# Altium footprint library CUSTOM PCB.PcbLib: 404 footprints (part 13 of 26)
Each footprint in its own frame and in the unit in brackets; x right, y up, seen from the top. Pads: shape width x height; smd on the part's side, far side on the other; paste and mask are expansions set on the pad; w line width, h text height; cw(c..) or ccw(c..) is an arc to the next point about the centre after c.
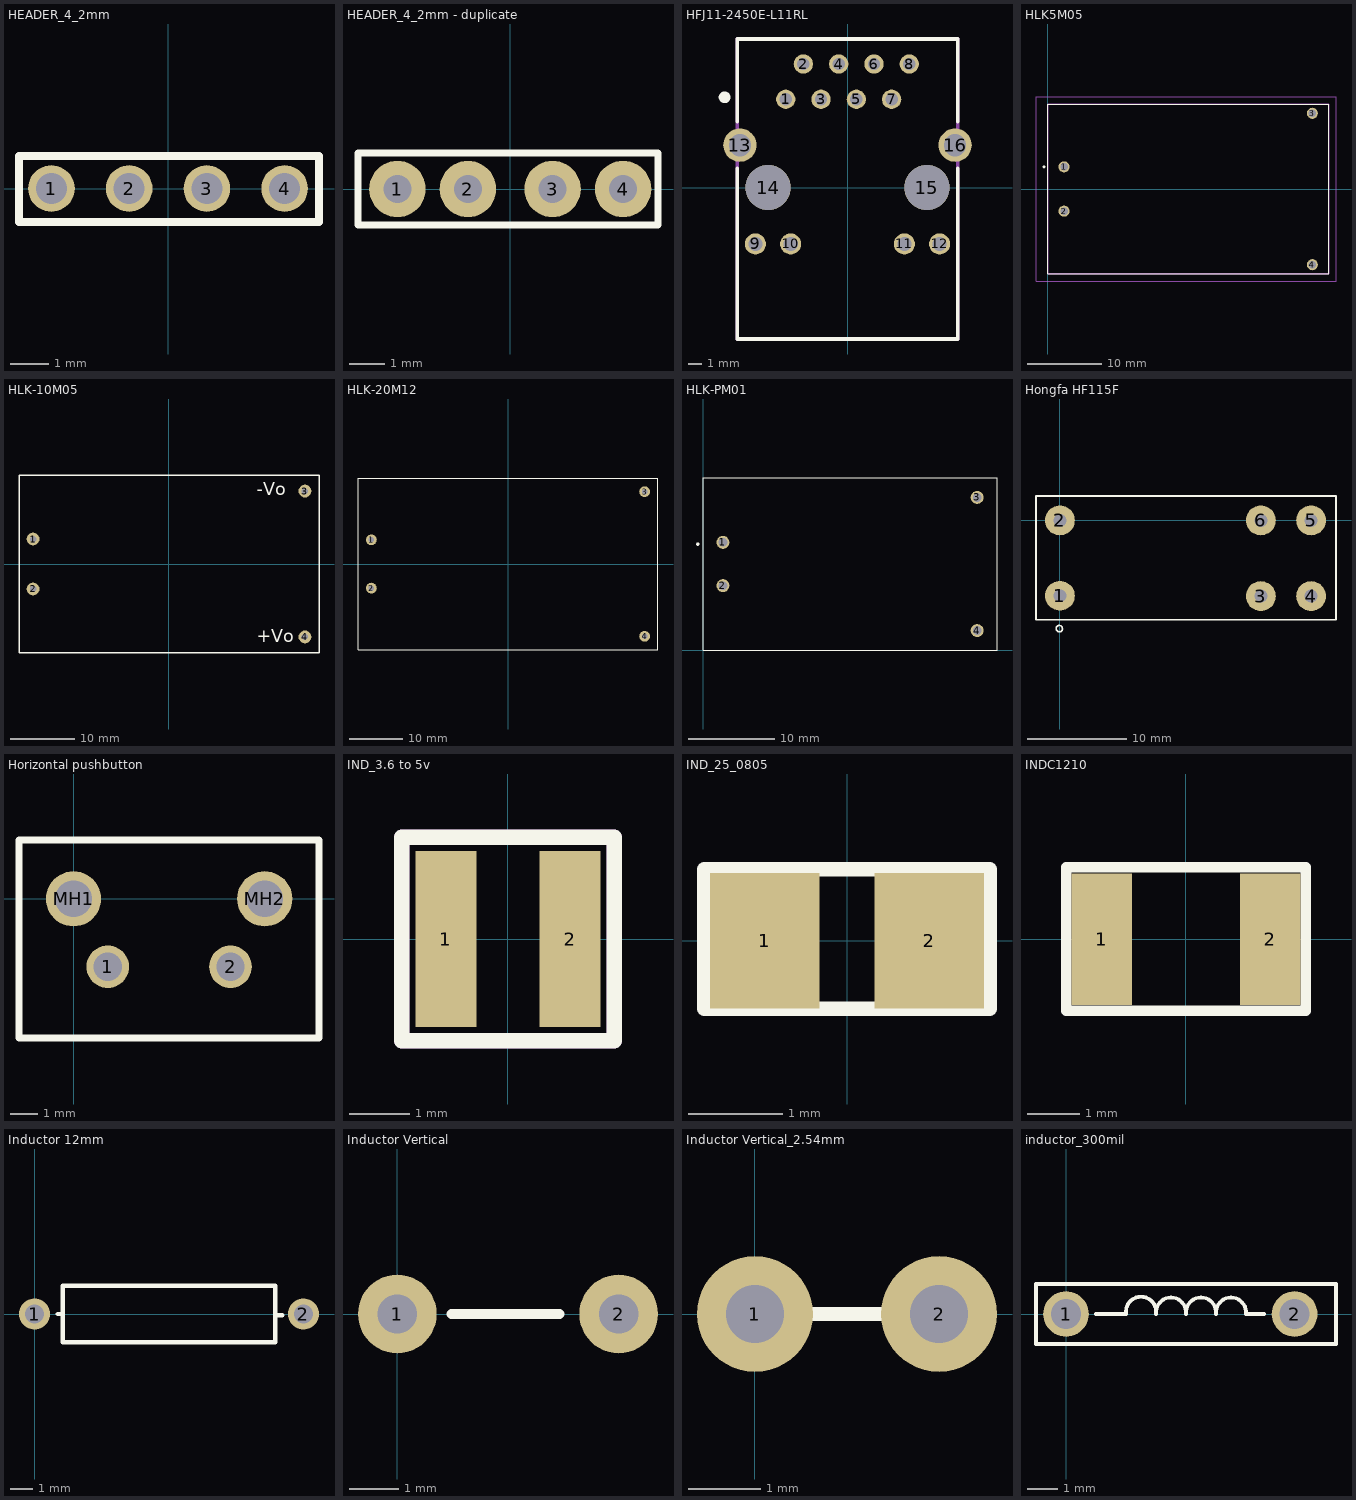
[diagram p12: the footprints below, top view; thin cyan lines are the x and y axes]

## HEADER_4_2mm [mm]
pads (4):
  round 1.2 hole 0.8: 1(-3,0) 2(-1,0) 3(1,0) 4(3,0)
Top Overlay:
  lines w0.2: -3.835,-0.864 -3.835,0.838 3.886,0.838 3.886,-0.864 -3.835,-0.864

## HEADER_4_2mm - duplicate [mm]
pads (4):
  round 1.6 hole 0.8: 1(-3.2,0) 2(-1.2,0) 3(1.2,0) 4(3.2,0)
Top Overlay:
  lines w0.2: -4.318,-1.016 -4.318,1.016 4.191,1.016 4.191,-1.016 -4.318,-1.016

## HFJ11-2450E-L11RL [mm]
pads (16):
  round 1.39 hole 0.89: 1(-4.445,6.35) 2(-3.175,8.89) 3(-1.905,6.35) 4(-0.635,8.89) 5(0.635,6.35) 6(1.905,8.89) 7(3.175,6.35) 8(4.445,8.89)
  round 1.52 hole 1.02: 9(-6.63,-4.06) 10(-4.09,-4.06) 11(4.09,-4.06) 12(6.63,-4.06)
  round 2.4 hole 1.6: 13(-7.745,3.05) 16(7.745,3.05)
  round 3.25 hole 3.25 unplated: 14(-5.715,0) 15(5.715,0)
Top Overlay:
  circle w0.5: c-8.845,6.494 r0.174
  lines w0.254: -7.94,1.4 -7.94,-10.9 7.94,-10.9 7.94,1.4 ; -7.94,4.75 -7.94,10.69 7.94,10.69 7.94,4.75
Mechanical 13:
  lines w0.254: -7.94,-10.9 -7.94,10.69 7.94,10.69 7.94,-10.9 -7.94,-10.9
3D body "Halo RJ45 Socket HFJ11-1G01ERL.STEP": height 15.57, standoff -3.12, extent -9.5,-10.795 9.5,10.795

## HLK5M05 [mm]
pads (4):
  round 1.5 hole 1: 1(2.2,3) 2(2.2,-3) 3(35.8,10.25) 4(35.8,-10.25)
Top Overlay:
  lines w0.1: 0,-11.5 38,-11.5 38,11.5 0,11.5 0,-11.5
  lines w0.2: -0.5,2.9 ccw(c-0.5,3) -0.5,3.1 ccw(c-0.5,3) -0.5,2.9
Mechanical 15:
  lines w0.2: 0,-11.5 38,-11.5 38,11.5 0,11.5 0,-11.5
Mechanical 20:
  lines w0.1: -1.6,-12.5 39,-12.5 39,12.5 -1.6,12.5 -1.6,-12.5
3D body: height 18, standoff 0, extent 0.01,-11.61 38.18,11.48
3D body: height 0, standoff -5, extent 34.808,-11.248 36.8,-9.252
3D body: height 0, standoff -5, extent 34.808,9.252 36.8,11.248
3D body: height 0, standoff -5, extent 1.208,2.002 3.2,3.998
3D body: height 0, standoff -5, extent 1.208,-3.998 3.2,-2.002

## HLK-10M05 [mm]
pads (4):
  round 2 hole 1: 1(-21.25,3.9) 2(-21.25,-3.9) 3(21.25,11.4) 4(21.25,-11.4)
Top Overlay:
  lines w0.2: -23.45,-13.9 -23.45,13.9 23.45,13.9 23.45,-13.9 -23.45,-13.9
  text "-Vo" at 13.736,10.713 h2
  text "+Vo" at 13.736,-12.249 h2
3D body: height 21.8, standoff 0, extent -23.45,-13.9 23.45,13.959

## HLK-20M12 [mm]
pads (4):
  round 2 hole 1: 1(-25.5,4.5) 2(-25.5,-4.5) 3(25.5,13.5) 4(25.5,-13.5)
Top Overlay:
  lines w0.2: -28,-16 -28,16 28,16 28,-16 -28,-16
3D body: height 22.5, standoff 0, extent -28,-16 28,16

## HLK-PM01 [mm]
pads (4):
  round 1.5 hole 1: 1(2.3,12.5) 2(2.3,7.5) 3(31.7,17.7) 4(31.7,2.3)
Top Overlay:
  lines w0.1: 0,0 34,0 34,20 0,20 0,0
  lines w0.2: -0.6,12.2 ccw(c-0.6,12.3) -0.6,12.4 ccw(c-0.6,12.3) -0.6,12.2
3D body: height 5, standoff 0, extent 1.903,7.101 2.7,7.899
3D body: height 5, standoff 0, extent 1.903,12.101 2.7,12.899
3D body: height 5, standoff 0, extent 31.303,1.901 32.1,2.699
3D body: height 5, standoff 0, extent 31.303,17.301 32.1,18.099
3D body: height 15, standoff 0, extent 0,0 34,20

## Hongfa HF115F [mm] "5VDC 16A"
pads (6):
  round 3 hole 1.3: 1(0,-7.56) 2(0,0) 3(20.16,-7.6) 4(25.2,-7.6) 5(25.2,0) 6(20.16,0)
Top Overlay:
  circle w0.127: c-0.06,-10.86 r0.322
  lines w0.19: -2.4,2.4 -2.4,-9.97 27.58,-9.97 27.7,-9.97 27.7,2.43 -2.4,2.43
3D body: height 15.7, standoff 0, extent -2.33,-9.97 27.69,2.4

## Horizontal pushbutton [mm]
pads (4):
  round 1.561 hole 1.041: 1(1.255,-2.49) 2(5.755,-2.49)
  round 2.026 hole 1.351: MH1(0,0) MH2(7.01,0)
Top Overlay:
  lines w0.254: -2,-5.105 9,-5.105 9,2.159 -2,2.159 -2,-5.105
3D body "User Library-Alps TACT SKHH Horizontal Switch.X_T": height 7.37, standoff -3.5, extent -0.496,-10.921 7.862,1.549

## IND_3.6 to 5v [mm] "EPL3015-472MLB"
pads (2):
  rect 1x2.9 smd: 1(-1.023,0) 2(1.023,0)
Top Overlay:
  lines w0.254: -1.753,-1.676 1.753,-1.676 1.753,1.676 -1.753,1.676 -1.753,-1.676
Mechanical 1:
  lines w0.254: 1.702,-1.676 -1.753,-1.676 -1.753,1.676 1.753,1.676 ; 1.753,-1.676 1.753,1.626
3D body "EPL3015-472MLB.stp": height 1.55, standoff 0, extent -1.5,-1.5 1.5,1.5

## IND_25_0805 [mil]
pads (2):
  rect 46x57 smd paste+0 mask+0: 1(-34.5,0) 2(34.5,0)
Top Overlay:
  lines w6: -60,-28.5 -60,30 60,30 60,-28.5 -60,-28.5
3D body "IND_25_0805.step": height 42.99, standoff 0, extent -43.5,-28.5 43.5,28.5

## INDC1210 [mm]
pads (2):
  rect 1.145x2.5 smd: 1(-1.6,0) 2(1.6,0)
Top Overlay:
  lines w0.2: -2.275,-1.358 2.277,-1.358 2.277,1.362 -2.275,1.362 -2.275,-1.358

## Inductor 12mm [mm]
pads (2):
  round 1.4 hole 0.85: 1(0,0) 2(12.065,0)
Top Overlay:
  lines w0.2: 1.041,0 1.27,0 ; 10.897,-0.051 11.125,-0.051 ; 1.27,-1.27 10.795,-1.27 10.795,1.27 1.27,1.27 1.27,-1.27
3D body: height 0.25, standoff 0, extent 3.607,1.829 3.607,1.829
3D body: height 0.25, standoff 0, extent 0.66,1.499 0.66,1.499
3D body "User Library-res_05x12_5.STEP": height 1.6, standoff -3.8, extent -0.53,-1.6 12.57,1.6

## Inductor Vertical [mm]
pads (2):
  round 1.6 hole 0.8: 1(0,0) 2(4.5,0)
Top Overlay:
  lines w0.2: 1.1,0 3.3,0

## Inductor Vertical_2.54mm [mm]
pads (2):
  round 1.6 hole 0.8: 1(0,0)
  round 1.6 hole 0.8 paste+0: 2(2.54,0)
Top Overlay:
  lines w0.2: 0,0 2.54,0

## inductor_300mil [mil] "1mH"
pads (2):
  round 60 hole 39.37: 1(0,0) 2(300,0)
Top Overlay:
  lines w5: 39.37,0 78.74,0 cw(c98.43,2.76) 118.11,0 cw(c137.8,1.88) 157.48,0 cw(c177.17,1.9) 196.85,0 cw(c216.54,1.88) 236.22,0 259.84,0 ; -39.37,-39.37 354.33,-39.37 354.33,39.37 -39.37,39.37 -39.37,-39.37
3D body "Actual resistor.stp": height 80.17, standoff -67.26, extent -38.63,-39.67 342.01,41.85